# Altium footprint library IC.PcbLib: 386 footprints (part 29 of 30)
Each footprint in its own frame and in the unit in brackets; x right, y up, seen from the top. Pads: shape width x height; smd on the part's side, far side on the other; paste and mask are expansions set on the pad; w line width, h text height; cw(c..) or ccw(c..) is an arc to the next point about the centre after c.
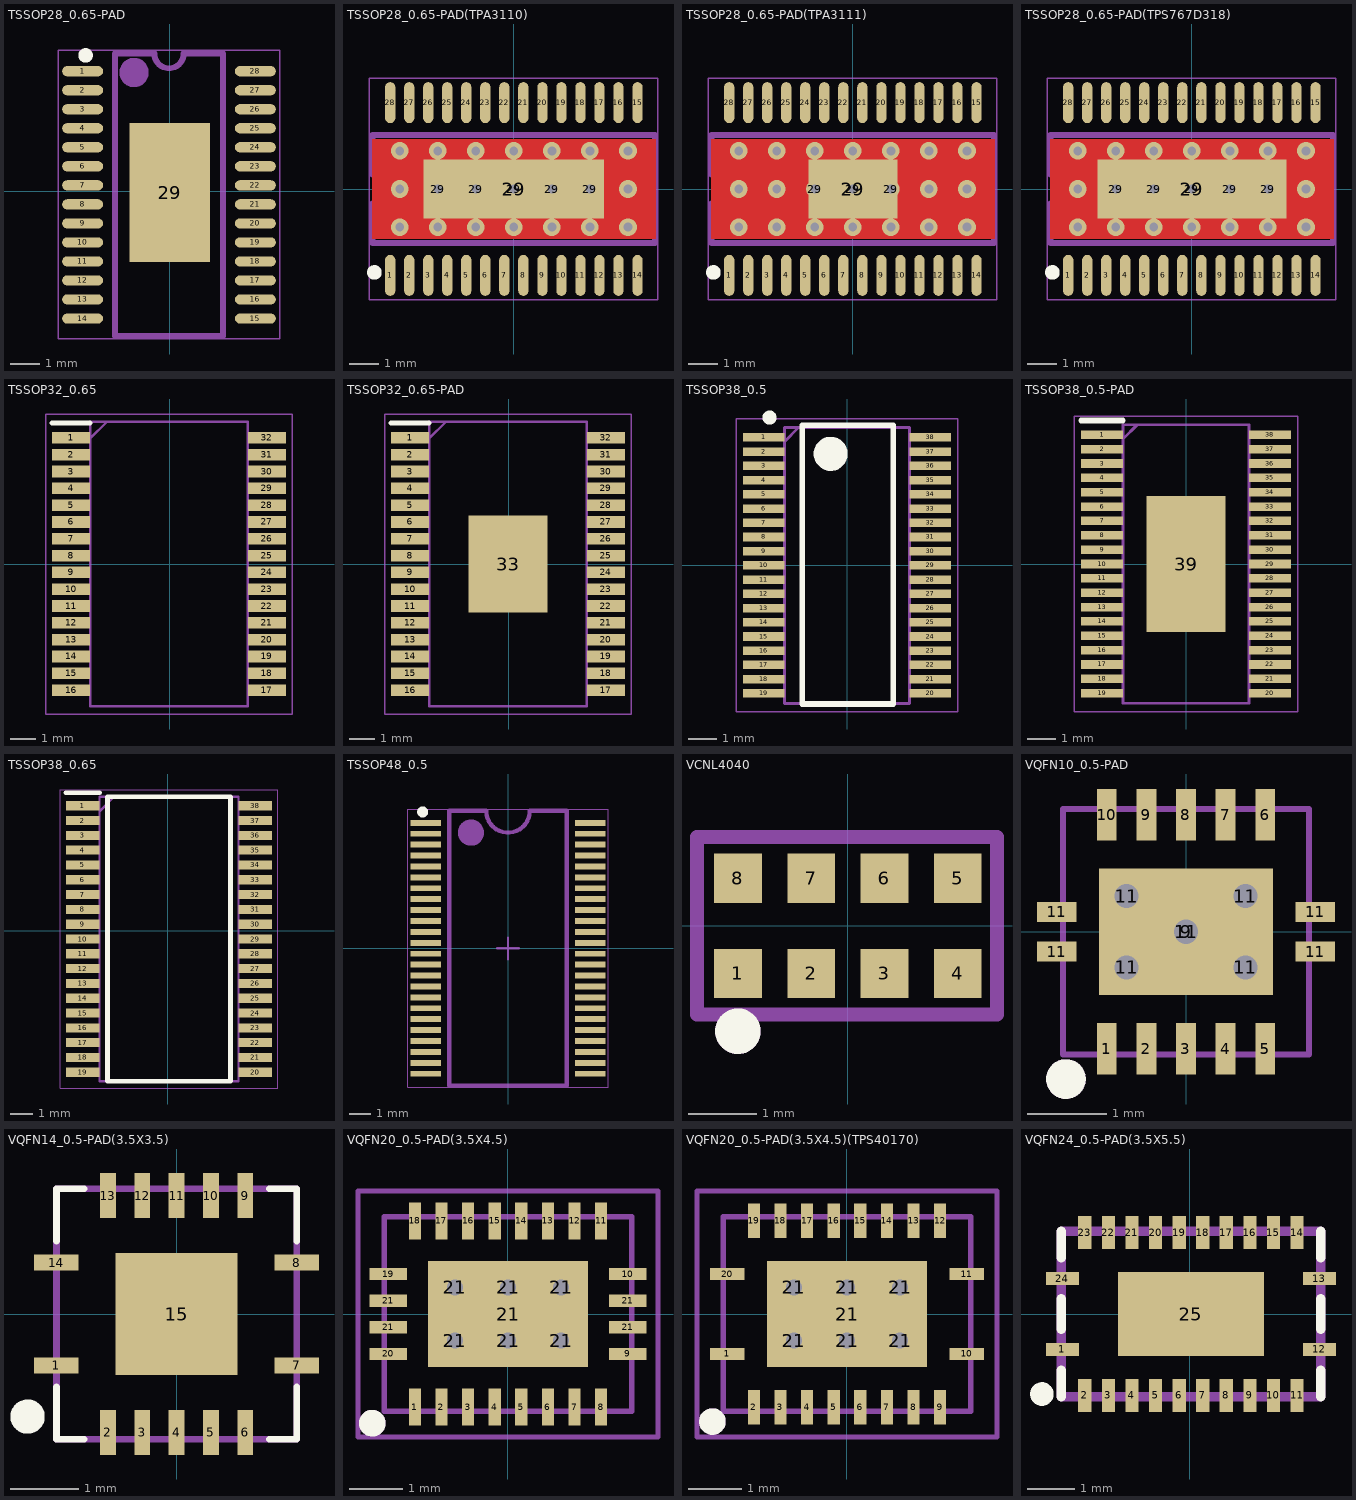
[diagram p28: the footprints below, top view; thin cyan lines are the x and y axes]

## TSSOP28_0.65-PAD [mm]
pads (29):
  oval 1.4x0.35 smd: 1(-2.975,4.098) 2(-2.975,3.448) 3(-2.975,2.798) 4(-2.975,2.148) 5(-2.975,1.498) 6(-2.975,0.848) 7(-2.975,0.198) 8(-2.975,-0.452) 9(-2.975,-1.102) 10(-2.975,-1.752) 11(-2.975,-2.402) 12(-2.975,-3.052) 13(-2.975,-3.702) 14(-2.975,-4.352) 15(2.925,-4.352) 16(2.925,-3.702) 17(2.925,-3.052) 18(2.925,-2.402) 19(2.925,-1.752) 20(2.925,-1.102) 21(2.925,-0.452) 22(2.925,0.198) 23(2.925,0.848) 24(2.925,1.498) 25(2.925,2.148) 26(2.925,2.798) 27(2.925,3.448) 28(2.925,4.098)
  rect 2.74x4.75 smd: 29(0,-0.051)
Top Overlay:
  circle w0.25: c-2.875,4.637 r0.125
Mechanical 15:
  circle w0.6: c-1.219,4.053 r0.2
  lines w0.05: -3.81,-5.044 3.759,-5.044 3.759,4.815 -3.81,4.815 -3.81,-5.044
  lines w0.1: -0.5,0.102 0.5,0.102 ; 0,-0.398 0,0.602
  lines w0.2: 1.825,4.698 0.475,4.698 cw(c-0.025,4.698) -0.525,4.698 -1.875,4.698 -1.875,-4.952 1.825,-4.952 1.825,4.699
3D body "TSSOP28-0.65B.STEP": height 1.2, standoff 0, extent -3.225,-5.027 3.175,4.773

## TSSOP28_0.65-PAD(TPA3110) [mm]
pads (34):
  oval 0.35x1.4 smd: 1(-4.225,-2.95) 2(-3.575,-2.95) 3(-2.925,-2.95) 4(-2.275,-2.95) 5(-1.625,-2.95) 6(-0.975,-2.95) 7(-0.325,-2.95) 8(0.325,-2.95) 9(0.975,-2.95) 10(1.625,-2.95) 11(2.275,-2.95) 12(2.925,-2.95) 13(3.575,-2.95) 14(4.225,-2.95) 15(4.225,2.95) 16(3.575,2.95) 17(2.925,2.95) 18(2.275,2.95) 19(1.625,2.95) 20(0.975,2.95) 21(0.325,2.95) 22(-0.325,2.95) 23(-0.975,2.95) 24(-1.625,2.95) 25(-2.275,2.95) 26(-2.925,2.95) 27(-3.575,2.95) 28(-4.225,2.95)
  round 0.6 hole 0.3: 29(-2.6,0) 29(-1.3,0) 29(0,0) 29(1.3,0) 29(2.6,0)
  rect 6.17x2 smd paste-10: 29(0,0)
via -3.9,0 diameter 0.6 hole 0.3
via 3.9,0 diameter 0.6 hole 0.3
via -2.6,-1.3 diameter 0.6 hole 0.3
via -3.9,-1.3 diameter 0.6 hole 0.3
via -1.3,-1.3 diameter 0.6 hole 0.3
via 0,-1.3 diameter 0.6 hole 0.3
via 1.3,-1.3 diameter 0.6 hole 0.3
via 2.6,-1.3 diameter 0.6 hole 0.3
via 3.9,-1.3 diameter 0.6 hole 0.3
via 3.9,1.3 diameter 0.6 hole 0.3
via 2.6,1.3 diameter 0.6 hole 0.3
via 1.3,1.3 diameter 0.6 hole 0.3
via 0,1.3 diameter 0.6 hole 0.3
via -1.3,1.3 diameter 0.6 hole 0.3
via -3.9,1.3 diameter 0.6 hole 0.3
via -2.6,1.3 diameter 0.6 hole 0.3
Top Layer:
  region: 4.85,-1.7 4.85,1.7 -4.85,1.7 -4.85,-1.7
Top Overlay:
  circle w0.25: c-4.764,-2.85 r0.125
Top Paste:
  region: -1.088,0.993 -1.088,0.127 -0.145,0.127 -0.145,0.993
  region: -0.145,-0.993 -0.145,-0.127 -1.088,-0.127 -1.088,-0.993
  region: 1.088,-0.993 1.088,-0.127 0.145,-0.127 0.145,-0.993
  region: 0.145,0.993 0.145,0.127 1.088,0.127 1.088,0.993
  region: -1.378,-0.993 -1.378,-0.127 -2.321,-0.127 -2.321,-0.993
  region: -2.321,0.993 -2.321,0.127 -1.378,0.127 -1.378,0.993
  region: 1.378,0.993 1.378,0.127 2.321,0.127 2.321,0.993
  region: 2.321,-0.993 2.321,-0.127 1.378,-0.127 1.378,-0.993
  region: -2.611,-0.993 -2.611,-0.127 -3.073,-0.127 -3.073,-0.993
  region: -2.611,0.127 -2.611,0.993 -3.073,0.993 -3.073,0.127
  region: 2.611,-0.127 2.611,-0.993 3.073,-0.993 3.073,-0.127
  region: 2.611,0.993 2.611,0.127 3.073,0.127 3.073,0.993
Mechanical 15:
  circle w0.6: c-4.18,-1.194 r0.2
  lines w0.05: -4.942,-3.785 -4.942,3.785 4.917,3.785 4.917,-3.785 -4.942,-3.785
  lines w0.2: -4.826,1.85 4.825,1.85 4.825,-1.85 -4.825,-1.85 -4.825,-0.5 ccw(c-4.825,0) -4.825,0.5 -4.825,1.85
3D body "TSSOP28-0.65B.STEP": height 1.2, standoff 0, extent -4.9,-3.2 4.9,3.2

## TSSOP28_0.65-PAD(TPA3111) [mm]
pads (32):
  oval 0.35x1.4 smd: 1(-4.225,-2.95) 2(-3.575,-2.95) 3(-2.925,-2.95) 4(-2.275,-2.95) 5(-1.625,-2.95) 6(-0.975,-2.95) 7(-0.325,-2.95) 8(0.325,-2.95) 9(0.975,-2.95) 10(1.625,-2.95) 11(2.275,-2.95) 12(2.925,-2.95) 13(3.575,-2.95) 14(4.225,-2.95) 15(4.225,2.95) 16(3.575,2.95) 17(2.925,2.95) 18(2.275,2.95) 19(1.625,2.95) 20(0.975,2.95) 21(0.325,2.95) 22(-0.325,2.95) 23(-0.975,2.95) 24(-1.625,2.95) 25(-2.275,2.95) 26(-2.925,2.95) 27(-3.575,2.95) 28(-4.225,2.95)
  round 0.6 hole 0.3: 29(-1.3,0) 29(0,0) 29(1.3,0)
  rect 3.04x2 smd paste-5: 29(0,0)
via -2.6,1.3 diameter 0.6 hole 0.3
via -3.9,1.3 diameter 0.6 hole 0.3
via -1.3,1.3 diameter 0.6 hole 0.3
via 0,1.3 diameter 0.6 hole 0.3
via 1.3,1.3 diameter 0.6 hole 0.3
via 2.6,1.3 diameter 0.6 hole 0.3
via 3.9,1.3 diameter 0.6 hole 0.3
via 3.9,-1.3 diameter 0.6 hole 0.3
via 2.6,-1.3 diameter 0.6 hole 0.3
via 1.3,-1.3 diameter 0.6 hole 0.3
via 0,-1.3 diameter 0.6 hole 0.3
via -1.3,-1.3 diameter 0.6 hole 0.3
via -3.9,-1.3 diameter 0.6 hole 0.3
via -2.6,-1.3 diameter 0.6 hole 0.3
via 3.9,0 diameter 0.6 hole 0.3
via -3.9,0 diameter 0.6 hole 0.3
via 2.6,0 diameter 0.6 hole 0.3
via -2.6,0 diameter 0.6 hole 0.3
Top Layer:
  region: 4.85,-1.7 4.85,1.7 -4.85,1.7 -4.85,-1.7
Top Overlay:
  circle w0.25: c-4.764,-2.85 r0.125
Top Paste:
  region: -1.448,0.993 -1.448,0.127 -0.145,0.127 -0.145,0.993
  region: -0.145,-0.993 -0.145,-0.127 -1.448,-0.127 -1.448,-0.993
  region: 1.448,-0.993 1.448,-0.127 0.145,-0.127 0.145,-0.993
  region: 0.145,0.993 0.145,0.127 1.448,0.127 1.448,0.993
Mechanical 15:
  circle w0.6: c-4.18,-1.194 r0.2
  lines w0.05: -4.942,-3.785 4.917,-3.785 4.917,3.785 -4.942,3.785 -4.942,-3.785
  lines w0.2: -4.826,1.85 4.825,1.85 4.825,-1.85 -4.825,-1.85 -4.825,-0.5 ccw(c-4.825,0) -4.825,0.5 -4.825,1.85
3D body "TSSOP28-0.65B.STEP": height 1.2, standoff 0, extent -4.9,-3.2 4.9,3.2

## TSSOP28_0.65-PAD(TPS767D318) [mm]
pads (34):
  oval 0.35x1.4 smd: 1(-4.225,-2.95) 2(-3.575,-2.95) 3(-2.925,-2.95) 4(-2.275,-2.95) 5(-1.625,-2.95) 6(-0.975,-2.95) 7(-0.325,-2.95) 8(0.325,-2.95) 9(0.975,-2.95) 10(1.625,-2.95) 11(2.275,-2.95) 12(2.925,-2.95) 13(3.575,-2.95) 14(4.225,-2.95) 15(4.225,2.95) 16(3.575,2.95) 17(2.925,2.95) 18(2.275,2.95) 19(1.625,2.95) 20(0.975,2.95) 21(0.325,2.95) 22(-0.325,2.95) 23(-0.975,2.95) 24(-1.625,2.95) 25(-2.275,2.95) 26(-2.925,2.95) 27(-3.575,2.95) 28(-4.225,2.95)
  round 0.6 hole 0.3: 29(-2.6,0) 29(-1.3,0) 29(0,0) 29(1.3,0) 29(2.6,0)
  rect 6.46x2 smd paste-10: 29(0,0)
via -3.9,0 diameter 0.6 hole 0.3
via 3.9,0 diameter 0.6 hole 0.3
via -2.6,-1.3 diameter 0.6 hole 0.3
via -3.9,-1.3 diameter 0.6 hole 0.3
via -1.3,-1.3 diameter 0.6 hole 0.3
via 0,-1.3 diameter 0.6 hole 0.3
via 1.3,-1.3 diameter 0.6 hole 0.3
via 2.6,-1.3 diameter 0.6 hole 0.3
via 3.9,-1.3 diameter 0.6 hole 0.3
via 3.9,1.3 diameter 0.6 hole 0.3
via 2.6,1.3 diameter 0.6 hole 0.3
via 1.3,1.3 diameter 0.6 hole 0.3
via 0,1.3 diameter 0.6 hole 0.3
via -1.3,1.3 diameter 0.6 hole 0.3
via -3.9,1.3 diameter 0.6 hole 0.3
via -2.6,1.3 diameter 0.6 hole 0.3
Top Layer:
  region: 4.85,-1.7 4.85,1.7 -4.85,1.7 -4.85,-1.7
Top Overlay:
  circle w0.25: c-4.764,-2.85 r0.125
Top Paste:
  region: -1.088,0.993 -1.088,0.127 -0.145,0.127 -0.145,0.993
  region: -0.145,-0.993 -0.145,-0.127 -1.088,-0.127 -1.088,-0.993
  region: 1.088,-0.993 1.088,-0.127 0.145,-0.127 0.145,-0.993
  region: 0.145,0.993 0.145,0.127 1.088,0.127 1.088,0.993
  region: -1.378,-0.993 -1.378,-0.127 -2.321,-0.127 -2.321,-0.993
  region: -2.321,0.993 -2.321,0.127 -1.378,0.127 -1.378,0.993
  region: 1.378,0.993 1.378,0.127 2.321,0.127 2.321,0.993
  region: 2.321,-0.993 2.321,-0.127 1.378,-0.127 1.378,-0.993
  region: -2.611,-0.993 -2.611,-0.127 -3.073,-0.127 -3.073,-0.993
  region: -2.611,0.127 -2.611,0.993 -3.073,0.993 -3.073,0.127
  region: 2.611,-0.127 2.611,-0.993 3.073,-0.993 3.073,-0.127
  region: 2.611,0.993 2.611,0.127 3.073,0.127 3.073,0.993
Mechanical 15:
  circle w0.6: c-4.18,-1.194 r0.2
  lines w0.05: -4.942,-3.785 -4.942,3.785 4.917,3.785 4.917,-3.785 -4.942,-3.785
  lines w0.2: -4.826,1.85 4.825,1.85 4.825,-1.85 -4.825,-1.85 -4.825,-0.5 ccw(c-4.825,0) -4.825,0.5 -4.825,1.85
3D body "TSSOP28-0.65B.STEP": height 1.2, standoff 0, extent -4.9,-3.2 4.9,3.2

## TSSOP32_0.65 [mm]
pads (32):
  rect 1.475x0.45 smd: 1(-3.813,4.875) 2(-3.813,4.225) 3(-3.813,3.575) 4(-3.813,2.925) 5(-3.813,2.275) 6(-3.813,1.625) 7(-3.813,0.975) 8(-3.813,0.325) 9(-3.813,-0.325) 10(-3.813,-0.975) 11(-3.813,-1.625) 12(-3.813,-2.275) 13(-3.813,-2.925) 14(-3.813,-3.575) 15(-3.813,-4.225) 16(-3.813,-4.875) 17(3.763,-4.875) 18(3.763,-4.225) 19(3.763,-3.575) 20(3.763,-2.925) 21(3.763,-2.275) 22(3.763,-1.625) 23(3.763,-0.975) 24(3.763,-0.325) 25(3.763,0.325) 26(3.763,0.975) 27(3.763,1.625) 28(3.763,2.275) 29(3.763,2.925) 30(3.763,3.575) 31(3.763,4.225) 32(3.763,4.875)
Top Overlay:
  lines w0.2: -4.55,5.45 -3.075,5.45
Mechanical 13:
  lines w0.1: -3.075,4.85 -2.425,5.5 ; -3.075,-5.5 -3.075,5.5 3.025,5.5 3.025,-5.5 -3.075,-5.5
Mechanical 15:
  lines w0.05: -4.8,-5.8 -4.8,5.8 4.75,5.8 4.75,-5.8 -4.8,-5.8
3D body "TPA3116D2QDADRQ1.stp": height 1.2, standoff 0, extent -4.075,-5.5 4.025,5.5

## TSSOP32_0.65-PAD [mm]
pads (33):
  rect 1.475x0.45 smd: 1(-3.813,4.875) 2(-3.813,4.225) 3(-3.813,3.575) 4(-3.813,2.925) 5(-3.813,2.275) 6(-3.813,1.625) 7(-3.813,0.975) 8(-3.813,0.325) 9(-3.813,-0.325) 10(-3.813,-0.975) 11(-3.813,-1.625) 12(-3.813,-2.275) 13(-3.813,-2.925) 14(-3.813,-3.575) 15(-3.813,-4.225) 16(-3.813,-4.875) 17(3.763,-4.875) 18(3.763,-4.225) 19(3.763,-3.575) 20(3.763,-2.925) 21(3.763,-2.275) 22(3.763,-1.625) 23(3.763,-0.975) 24(3.763,-0.325) 25(3.763,0.325) 26(3.763,0.975) 27(3.763,1.625) 28(3.763,2.275) 29(3.763,2.925) 30(3.763,3.575) 31(3.763,4.225) 32(3.763,4.875)
  rect 3.04x3.74 smd: 33(-0.025,0)
Top Overlay:
  lines w0.2: -4.55,5.45 -3.075,5.45
Mechanical 13:
  lines w0.1: -3.075,4.85 -2.425,5.5 ; -3.075,-5.5 3.025,-5.5 3.025,5.5 -3.075,5.5 -3.075,-5.5
Mechanical 15:
  lines w0.05: -4.8,-5.8 4.75,-5.8 4.75,5.8 -4.8,5.8 -4.8,-5.8
3D body "TPA3116D2QDADRQ1.stp": height 1.2, standoff 0, extent -4.075,-5.5 4.025,5.5

## TSSOP38_0.5 [mm]
pads (38):
  rect 1.45x0.3 smd: 1(-2.925,4.5) 2(-2.925,4) 3(-2.925,3.5) 4(-2.925,3) 5(-2.925,2.5) 6(-2.925,2) 7(-2.925,1.5) 8(-2.925,1) 9(-2.925,0.5) 10(-2.925,0) 11(-2.925,-0.5) 12(-2.925,-1) 13(-2.925,-1.5) 14(-2.925,-2) 15(-2.925,-2.5) 16(-2.925,-3) 17(-2.925,-3.5) 18(-2.925,-4) 19(-2.925,-4.5) 20(2.925,-4.5) 21(2.925,-4) 22(2.925,-3.5) 23(2.925,-3) 24(2.925,-2.5) 25(2.925,-2) 26(2.925,-1.5) 27(2.925,-1) 28(2.925,-0.5) 29(2.925,0) 30(2.925,0.5) 31(2.925,1) 32(2.925,1.5) 33(2.925,2) 34(2.925,2.5) 35(2.925,3) 36(2.925,3.5) 37(2.925,4) 38(2.925,4.5)
Top Overlay:
  circle w0.6: c-0.575,3.925 r0.3
  circle w0.25: c-2.725,5.2 r0.125
  lines w0.2: -1.575,-4.875 1.625,-4.875 1.625,4.925 -1.575,4.925 -1.575,-4.875
Mechanical 13:
  lines w0.1: -2.2,4.35 -1.7,4.85 ; -2.2,-4.85 2.2,-4.85 2.2,4.85 -2.2,4.85 -2.2,-4.85
Mechanical 15:
  lines w0.05: -3.9,-5.15 3.9,-5.15 3.9,5.15 -3.9,5.15 -3.9,-5.15
3D body "LT3507AEFE#PBF.stp": height 1.2, standoff 0, extent -3.2,-4.85 3.2,4.85

## TSSOP38_0.5-PAD [mm]
pads (39):
  rect 1.45x0.3 smd: 1(-2.925,4.5) 2(-2.925,4) 3(-2.925,3.5) 4(-2.925,3) 5(-2.925,2.5) 6(-2.925,2) 7(-2.925,1.5) 8(-2.925,1) 9(-2.925,0.5) 10(-2.925,0) 11(-2.925,-0.5) 12(-2.925,-1) 13(-2.925,-1.5) 14(-2.925,-2) 15(-2.925,-2.5) 16(-2.925,-3) 17(-2.925,-3.5) 18(-2.925,-4) 19(-2.925,-4.5) 20(2.925,-4.5) 21(2.925,-4) 22(2.925,-3.5) 23(2.925,-3) 24(2.925,-2.5) 25(2.925,-2) 26(2.925,-1.5) 27(2.925,-1) 28(2.925,-0.5) 29(2.925,0) 30(2.925,0.5) 31(2.925,1) 32(2.925,1.5) 33(2.925,2) 34(2.925,2.5) 35(2.925,3) 36(2.925,3.5) 37(2.925,4) 38(2.925,4.5)
  rect 2.74x4.75 smd: 39(0,0)
Top Overlay:
  lines w0.2: -3.65,5 -2.2,5
Mechanical 13:
  lines w0.1: -2.2,4.35 -1.7,4.85 ; -2.2,-4.85 2.2,-4.85 2.2,4.85 -2.2,4.85 -2.2,-4.85
Mechanical 15:
  lines w0.05: -3.9,-5.15 3.9,-5.15 3.9,5.15 -3.9,5.15 -3.9,-5.15
3D body "LT3507AEFE#PBF.stp": height 1.2, standoff 0, extent -3.2,-4.85 3.2,4.85

## TSSOP38_0.65 [mm]
pads (38):
  rect 1.475x0.4 smd: 1(-3.737,5.494) 2(-3.737,4.844) 3(-3.737,4.194) 4(-3.737,3.544) 5(-3.737,2.894) 6(-3.737,2.244) 7(-3.737,1.594) 8(-3.737,0.944) 9(-3.737,0.294) 10(-3.737,-0.356) 11(-3.737,-1.006) 12(-3.737,-1.656) 13(-3.737,-2.306) 14(-3.737,-2.956) 15(-3.737,-3.606) 16(-3.737,-4.256) 17(-3.737,-4.906) 18(-3.737,-5.556) 19(-3.737,-6.206) 20(3.839,-6.206) 21(3.839,-5.556) 22(3.839,-4.906) 23(3.839,-4.256) 24(3.839,-3.606) 25(3.839,-2.956) 26(3.839,-2.306) 27(3.839,-1.656) 28(3.839,-1.006) 29(3.839,-0.356) 30(3.839,0.294) 31(3.839,0.944) 32(3.839,1.594) 33(3.839,2.244) 34(3.839,2.894) 35(3.839,3.544) 36(3.839,4.194) 37(3.839,4.844) 38(3.839,5.494)
Top Overlay:
  lines w0.2: -4.474,6.069 -2.999,6.069 ; -2.649,-6.606 2.751,-6.606 2.751,5.894 -2.649,5.894 -2.649,-6.606
Mechanical 13:
  lines w0.1: -2.999,5.244 -2.349,5.894 ; -2.999,-6.606 3.101,-6.606 3.101,5.894 -2.999,5.894 -2.999,-6.606
Mechanical 15:
  lines w0.05: -4.724,-6.906 4.826,-6.906 4.826,6.194 -4.724,6.194 -4.724,-6.906
3D body "MSP430F5172IDAR.stp": height 1.2, standoff 0, extent -3.999,-6.606 4.101,5.894

## TSSOP48_0.5 [mm] "TSSOP, 48-Leads, Body 12.50x6.10mm, Pitch 0.50mm, IPC Low Density"
height 1.2
pads (48):
  rect 1.4x0.27 smd: 1(-3.773,5.75) 2(-3.773,5.25) 3(-3.773,4.75) 4(-3.773,4.25) 5(-3.773,3.75) 6(-3.773,3.25) 7(-3.773,2.75) 8(-3.773,2.25) 9(-3.773,1.75) 10(-3.773,1.25) 11(-3.773,0.75) 12(-3.773,0.25) 13(-3.773,-0.25) 14(-3.773,-0.75) 15(-3.773,-1.25) 16(-3.773,-1.75) 17(-3.773,-2.25) 18(-3.773,-2.75) 19(-3.773,-3.25) 20(-3.773,-3.75) 21(-3.773,-4.25) 22(-3.773,-4.75) 23(-3.773,-5.25) 24(-3.773,-5.75) 25(3.773,-5.75) 26(3.773,-5.25) 27(3.773,-4.75) 28(3.773,-4.25) 29(3.773,-3.75) 30(3.773,-3.25) 31(3.773,-2.75) 32(3.773,-2.25) 33(3.773,-1.75) 34(3.773,-1.25) 35(3.773,-0.75) 36(3.773,-0.25) 37(3.773,0.25) 38(3.773,0.75) 39(3.773,1.25) 40(3.773,1.75) 41(3.773,2.25) 42(3.773,2.75) 43(3.773,3.25) 44(3.773,3.75) 45(3.773,4.25) 46(3.773,4.75) 47(3.773,5.25) 48(3.773,5.75)
Top Overlay:
  circle w0.25: c-3.912,6.248 r0.125
Mechanical 15:
  circle w0.6: c-1.7,5.3 r0.3
  lines w0.05: -4.597,-6.375 4.597,-6.375 4.597,6.375 -4.597,6.375 -4.597,-6.375
  lines w0.1: -0.5,0 0.5,0 ; 0,-0.5 0,0.5
  lines w0.2: -2.7,-6.3 2.7,-6.3 2.7,6.3 1,6.3 cw(c0,6.3) -1,6.3 -2.7,6.3 -2.7,-6.3
3D body "TSSOP48.STEP": height 1.1, standoff 0, extent -4.05,-6.25 4.05,6.25

## VCNL4040 [mm]
height 2.39
pads (8):
  rect 0.7x0.725 smd: 1(-1.612,-0.7) 2(-0.537,-0.7) 3(0.537,-0.7) 4(1.612,-0.7) 5(1.612,0.7) 6(0.537,0.7) 7(-0.537,0.7) 8(-1.612,0.7)
Top Overlay:
  circle w0.384: c-1.612,-1.547 r0.141
Mechanical 15:
  circle w0.384: c-1.612,-1.547 r0.141
  lines w0.203: -2.212,-1.3 2.188,-1.3 2.188,1.3 -2.212,1.3 -2.212,-1.3
3D body "User Library-VCNL4040.STEP": height 1.1, standoff 0, extent -2.013,-1 1.988,1

## VQFN10_0.5-PAD [mm]
height 0.254
pads (20):
  rect 0.25x0.65 smd: 1(-1,-1.475) 2(-0.5,-1.475) 3(0,-1.475) 4(0.5,-1.475) 5(1,-1.475) 6(1,1.475) 7(0.5,1.475) 8(0,1.475) 9(-0.5,1.475) 10(-1,1.475)
  rect 2.2x1.6 smd paste-3: 9(0,0)
  rect 0.5x0.25 smd: 11(-1.63,-0.25) 11(-1.63,0.25) 11(1.63,-0.25) 11(1.63,0.25)
  round 0.61 hole 0.305: 11(-0.75,-0.45) 11(-0.75,0.45) 11(0,0) 11(0.75,-0.45) 11(0.75,0.45)
Top Overlay:
  circle w0.25: c-1.514,-1.859 r0.125
Top Paste:
  region: 1.092,0.125 1.092,0.775 0.125,0.775 0.125,0.125
  region: 0.125,-0.125 0.125,-0.775 1.092,-0.775 1.092,-0.125
  region: -1.092,-0.125 -1.092,-0.775 -0.125,-0.775 -0.125,-0.125
  region: -0.125,0.125 -0.125,0.775 -1.092,0.775 -1.092,0.125
Mechanical 15:
  circle w0.25: c-1.514,-1.859 r0.125
  lines w0.076: -1.55,-1.55 1.55,-1.55 1.55,1.55 -1.55,1.55 -1.55,-1.55
3D body "QFN10-3X3.STEP": height 1.05, standoff 0, extent -1.5,-1.51 1.5,1.51

## VQFN14_0.5-PAD(3.5X3.5) [mm]
height 1
pads (15):
  rect 0.65x0.23 smd: 1(-1.75,-0.75) 7(1.75,-0.75) 8(1.75,0.75) 14(-1.75,0.75)
  rect 0.23x0.65 smd: 2(-1,-1.725) 3(-0.5,-1.725) 4(0,-1.725) 5(0.5,-1.725) 6(1,-1.725) 9(1,1.725) 10(0.5,1.725) 11(0,1.725) 12(-0.5,1.725) 13(-1,1.725)
  rect 1.778x1.778 smd: 15(0,0)
Top Overlay:
  circle w0.25: c-2.169,-1.494 r0.125
  lines w0.1: -1.75,-1.061 -1.75,-1.825 -1.35,-1.825 ; -1.75,1.061 -1.75,1.825 -1.35,1.825 ; 1.35,-1.825 1.75,-1.825 1.75,-1.061 ; 1.35,1.825 1.75,1.825 1.75,1.061
Mechanical 13:
  lines w0.1: -1.75,-1.825 1.75,-1.825 1.75,1.825 -1.75,1.825 -1.75,-1.825
3D body: height 0.8, standoff 0, extent -1.75,-1.778 1.75,1.778
3D body: height 0.81, standoff 0.4, extent -1.575,-1.57 -1.077,-1.071

## VQFN20_0.5-PAD(3.5X4.5) [mm] "QFN, 20-Leads, Body 4.7x3.7mm (max), Pitch 1.50mm, Pitch1 0.50mm, IPC Low Density"
height 1
pads (31):
  rect 0.23x0.7 smd: 1(-1.75,-1.75) 2(-1.25,-1.75) 3(-0.75,-1.75) 4(-0.25,-1.75) 5(0.25,-1.75) 6(0.75,-1.75) 7(1.25,-1.75) 8(1.75,-1.75) 11(1.75,1.75) 12(1.25,1.75) 13(0.75,1.75) 14(0.25,1.75) 15(-0.25,1.75) 16(-0.75,1.75) 17(-1.25,1.75) 18(-1.75,1.75)
  rect 0.7x0.23 smd: 9(2.25,-0.75) 10(2.25,0.75) 19(-2.25,0.75) 20(-2.25,-0.75) 21(-2.25,-0.25) 21(-2.25,0.25) 21(2.25,-0.25) 21(2.25,0.25)
  round 0.6 hole 0.3: 21(-1,-0.5) 21(-1,0.5) 21(0,-0.5) 21(0,0.5) 21(1,-0.5) 21(1,0.5)
  rect 3x2 smd paste-3: 21(0,0)
Top Overlay:
  circle w0.25: c-2.55,-2.052 r0.125
Top Paste:
  region: 0.15,-0.15 0.15,-0.97 1.47,-0.97 1.47,-0.15
  region: 1.47,0.15 1.47,0.97 0.15,0.97 0.15,0.15
  region: -1.47,-0.15 -1.47,-0.97 -0.15,-0.97 -0.15,-0.15
  region: -0.15,0.15 -0.15,0.97 -1.47,0.97 -1.47,0.15
Mechanical 15:
  circle w0.25: c-2.55,-2.052 r0.125
  lines w0.1: -0.5,0 0.5,0 ; 0,-0.5 0,0.5 ; -2.819,-2.311 -2.819,2.311 2.819,2.311 2.819,-2.311 -2.819,-2.311 ; -2.325,-1.825 -2.325,1.825 2.325,1.825 2.325,-1.825 -2.325,-1.825
3D body "VQFN20-3.5X4.5.STEP": height 0.87, standoff -0.03, extent -2.26,-1.76 2.26,1.76

## VQFN20_0.5-PAD(3.5X4.5)(TPS40170) [mm] "QFN, 20-Leads, Body 4.7x3.7mm (max), Pitch 1.50mm, Pitch1 0.50mm, IPC Low Density"
height 1
pads (27):
  rect 0.65x0.23 smd: 1(-2.25,-0.75) 10(2.25,-0.75) 11(2.25,0.75) 20(-2.25,0.75)
  rect 0.23x0.65 smd: 2(-1.75,-1.75) 3(-1.25,-1.75) 4(-0.75,-1.75) 5(-0.25,-1.75) 6(0.25,-1.75) 7(0.75,-1.75) 8(1.25,-1.75) 9(1.75,-1.75) 12(1.75,1.75) 13(1.25,1.75) 14(0.75,1.75) 15(0.25,1.75) 16(-0.25,1.75) 17(-0.75,1.75) 18(-1.25,1.75) 19(-1.75,1.75)
  round 0.6 hole 0.3: 21(-1,-0.5) 21(-1,0.5) 21(0,-0.5) 21(0,0.5) 21(1,-0.5) 21(1,0.5)
  rect 3x2 smd paste-3: 21(0,0)
Top Overlay:
  circle w0.25: c-2.53,-2.022 r0.125
Top Paste:
  region: 0.15,-0.15 0.15,-0.97 1.47,-0.97 1.47,-0.15
  region: 1.47,0.15 1.47,0.97 0.15,0.97 0.15,0.15
  region: -1.47,-0.15 -1.47,-0.97 -0.15,-0.97 -0.15,-0.15
  region: -0.15,0.15 -0.15,0.97 -1.47,0.97 -1.47,0.15
Mechanical 15:
  circle w0.25: c-2.53,-2.022 r0.125
  lines w0.1: -0.5,0 0.5,0 ; 0,-0.5 0,0.5 ; -2.819,-2.311 -2.819,2.311 2.819,2.311 2.819,-2.311 -2.819,-2.311 ; -2.325,-1.825 -2.325,1.825 2.325,1.825 2.325,-1.825 -2.325,-1.825
3D body "VQFN20-3.5X4.5.STEP": height 0.87, standoff -0.03, extent -2.26,-1.76 2.26,1.76

## VQFN24_0.5-PAD(3.5X5.5) [mm]
height 1
pads (25):
  rect 0.7x0.28 smd: 1(-2.7,-0.75) 12(2.75,-0.75) 13(2.75,0.75) 24(-2.7,0.75)
  rect 0.28x0.7 smd: 2(-2.225,-1.725) 3(-1.725,-1.725) 4(-1.225,-1.725) 5(-0.725,-1.725) 6(-0.225,-1.725) 7(0.275,-1.725) 8(0.775,-1.725) 9(1.275,-1.725) 10(1.775,-1.725) 11(2.275,-1.725) 14(2.275,1.725) 15(1.775,1.725) 16(1.275,1.725) 17(0.775,1.725) 18(0.275,1.725) 19(-0.225,1.725) 20(-0.725,1.725) 21(-1.225,1.725) 22(-1.725,1.725) 23(-2.225,1.725)
  rect 3.1x1.778 smd: 25(0.025,0)
Top Overlay:
  circle w0.25: c-3.134,-1.697 r0.125
  lines w0.2: -2.725,-1.75 -2.725,-1.194 ; -2.725,-0.32 -2.725,0.32 ; -2.725,1.194 -2.725,1.75 ; 2.775,-1.75 2.775,-1.194 ; 2.775,-0.32 2.775,0.32 ; 2.775,1.194 2.775,1.75
Mechanical 13:
  lines w0.2: -2.725,-1.75 -2.725,1.75 2.775,1.75 2.775,-1.75 -2.725,-1.75
3D body "User Library-PVQFN-24.step": height 1.01, standoff -0.01, extent -2.799,-1.825 2.85,1.825